# Altium footprint library PBL - SMD Packages.PcbLib: 218 footprints (part 4 of 14)
Each footprint in its own frame and in the unit in brackets; x right, y up, seen from the top. Pads: shape width x height; smd on the part's side, far side on the other; paste and mask are expansions set on the pad; w line width, h text height; cw(c..) or ccw(c..) is an arc to the next point about the centre after c.
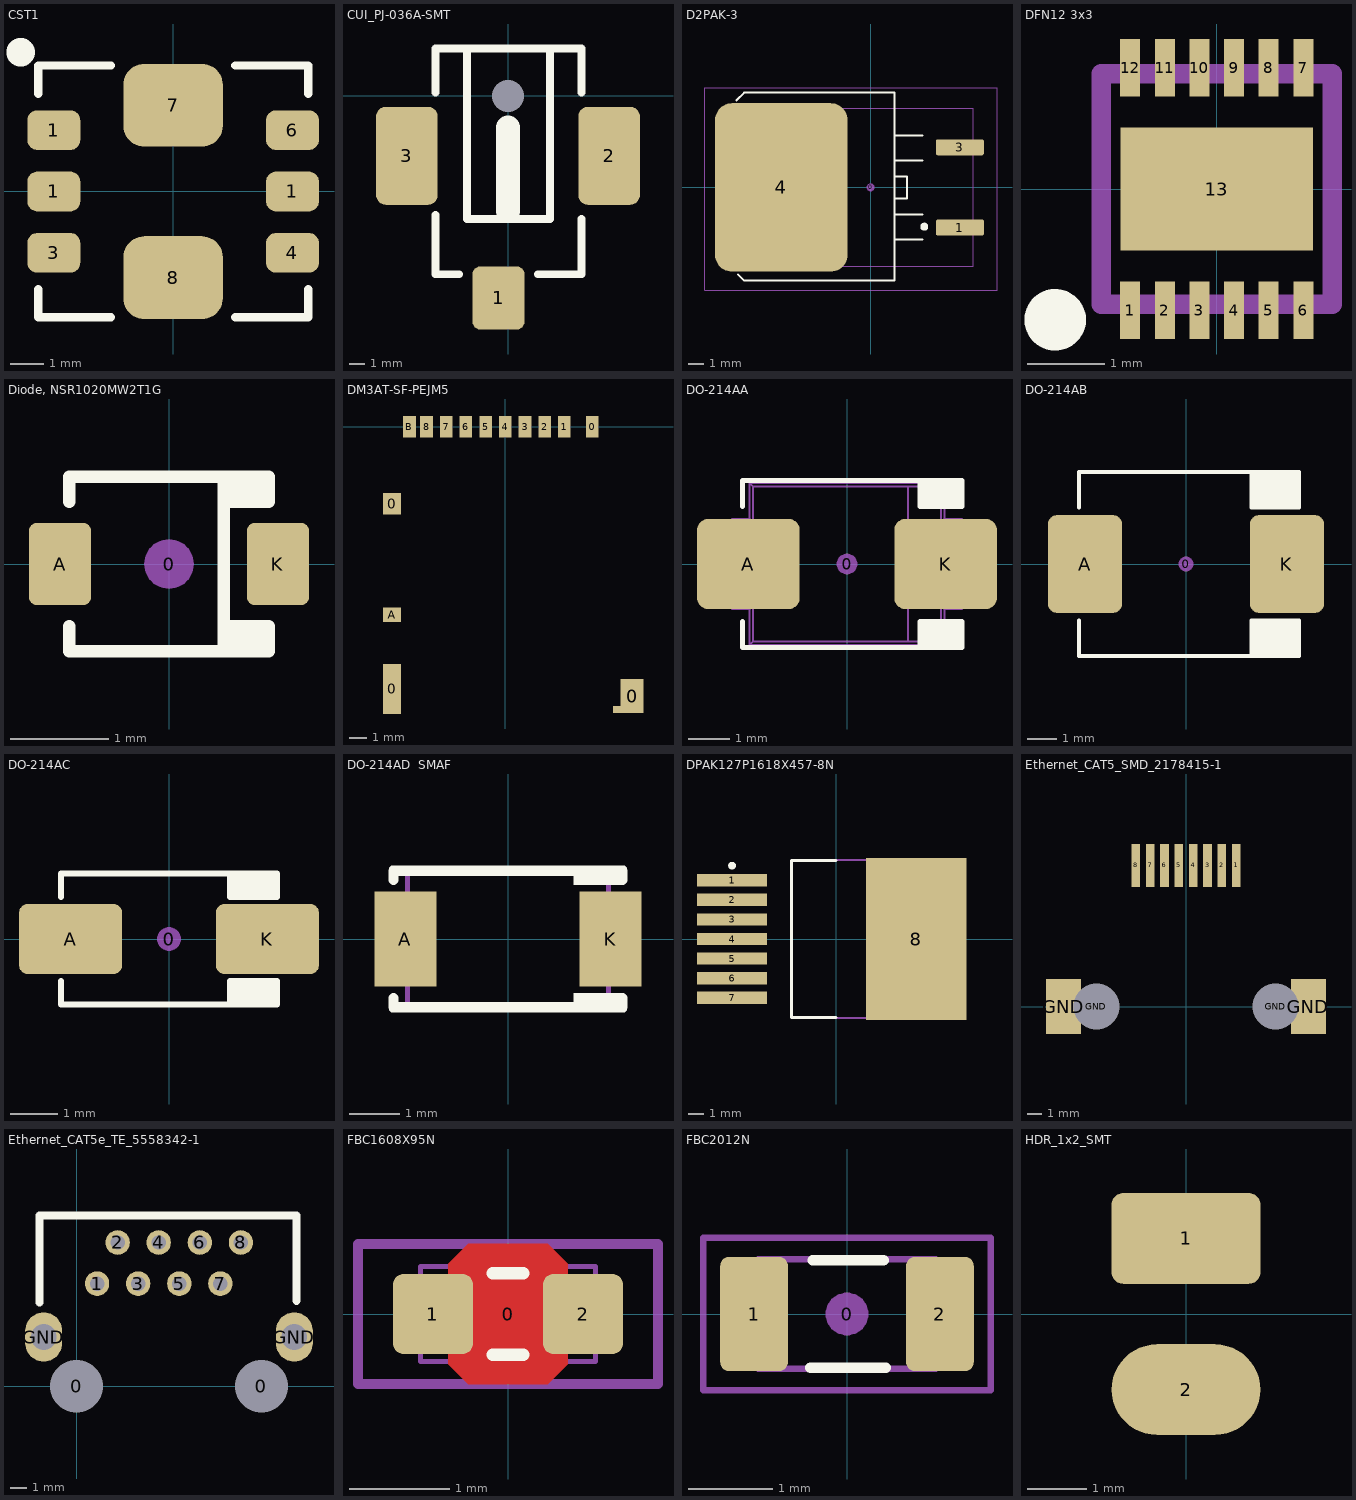
[diagram p3: the footprints below, top view; thin cyan lines are the x and y axes]

## CST1 [mm] "Current Transformer"
height 5.3
pads (8):
  rrect50% 1.6x1.2 smd: 1(-3.6,0) 1(-3.6,1.85) 1(3.6,0) 3(-3.6,-1.85) 4(3.6,-1.85) 6(3.6,1.85)
  rrect50% 3x2.5 smd: 7(0,2.6) 8(0,-2.6)
Top Overlay:
  circle w0.762: c-4.6,4.2 r0.05
  lines w0.254: -4.075,-2.95 -4.075,-3.8 -1.875,-3.8 ; -4.075,2.95 -4.075,3.8 -1.875,3.8 ; 1.875,-3.8 4.075,-3.8 4.075,-2.95 ; 1.875,3.8 4.075,3.8 4.075,2.95
3D body "Coilcraft-CST1.step": height 5.3, standoff -0.05, extent -4.065,-3.8 4.065,3.8

## CUI_PJ-036A-SMT [mm]
pads (4):
  rrect30% 3.3x4 smd: 1(-0.6,-12.8)
  rrect30% 3.9x6.2 smd: 2(6.4,-3.8) 3(-6.4,-3.8)
  rrect30% 0x0 hole 2.032 unplated: 4(0,0)
Top Overlay:
  lines w0.5: -4.6,-7.55 -4.6,-11.3 -3.1,-11.3 ; -4.6,0.2 -4.6,3 4.65,3 4.65,0.2 ; -2.6,3 -2.6,-7.8 2.65,-7.8 2.65,2.9 ; 1.9,-11.3 4.65,-11.3 4.65,-7.8
  lines w1.5: 0,-7.3 0,-2
3D body "CUI-PJ-036A-SMT.step": height 11.09, standoff -1.51, extent -7.5,-14.1 7.7,3

## D2PAK-3 [mil] "D-PAK/TO-263-3; 3 Leads (1 Cropped); Body 14.7 (inc. leads) x 10.2 mm (LxW max)"
height 180
pads (4):
  round 20 on Mech15: 0(0,0)
  rrect25% 120x40 smd: 1(222.5,-100) 3(222.5,100)
  rrect25% 330x420 smd: 4(-222.5,0)
Top Overlay:
  circle w9.84: c133.8,-97.83 r4.92
  lines w5: -334.65,216.54 -314.96,236.22 59.06,236.22 59.06,-232.28 -314.96,-232.28 -330.71,-216.54 ; 129.92,-129.92 59.06,-129.92 59.06,-66.93 129.92,-66.93 ; 129.92,66.93 59.06,66.93 59.06,129.92 129.92,129.92 ; 59.06,-27.56 90.55,-27.56 90.55,27.56 59.06,27.56 59.06,-27.56
13 - 3D Top Side:
  lines w3: -361.41,-196.85 -361.41,196.85 255.51,196.85 255.51,-196.85 -361.41,-196.85
15 - Top Courtyards:
  lines w3: -413.39,-255.91 314.96,-255.91 314.96,248.03 -413.39,248.03 -413.39,-255.91
3D body "SW3dPS-TO263-3S.STEP": height 189.36, standoff 0.39, extent -361.41,-196.85 255.51,196.85

## DFN12 3x3 [mm]
pads (13):
  rect 0.26x0.75 smd: 1(-1.125,-1.575) 2(-0.675,-1.575) 3(-0.225,-1.575) 4(0.225,-1.575) 5(0.675,-1.575) 6(1.125,-1.575) 7(1.125,1.575) 8(0.675,1.575) 9(0.225,1.575) 10(-0.225,1.575) 11(-0.675,1.575) 12(-1.125,1.575)
  rect 2.5x1.6 smd: 13(0,0)
Top Overlay:
  circle w0.4: c-2.1,-1.7 r0.2
13 - 3D Top Side:
  lines w0.254: -1.5,-1.5 -1.5,1.5 1.5,1.5 1.5,-1.5 -1.5,-1.5
3D body: height 0.9, standoff 0.1, extent -1.499,-1.499 1.499,1.499

## Diode, NSR1020MW2T1G [mil]
pads (3):
  round 20 on Mech15: 0(0,0)
  rrect25% 25x33 smd: A(-43.75,0) K(43.75,0)
Top Overlay:
  lines w5: -40,-25 -40,-35 40,-35 40,-25 22,-25 ; -40,25 -40,35 40,35 40,25 22,25 ; 22,-35 22,35 ; 25,-35 25,-25 ; 25,25 25,35 ; 28,-35 28,-25 ; 28,25 28,35 ; 31,-35 31,-25 ; 31,25 31,35 ; 34,-35 34,-25 ; 34,25 34,35 ; 37,-35 37,-25 ; 37,25 37,35

## DM3AT-SF-PEJM5 [mm]
pads (15):
  rect 1x2.8 smd: 0(-6.325,-14.65)
  rect 1x1.2 smd: 0(-6.325,-4.3)
  rect 0.7x1.2 smd: 0(4.85,0) 1(3.3,0) 2(2.2,0) 3(1.1,0) 4(0,0) 5(-1.1,0) 6(-2.2,0) 7(-3.3,0) 8(-4.4,0) B(-5.35,0)
  rect 0.4x0.4 smd: 0(6.225,-15.8)
  rect 1.3x1.9 smd: 0(7.075,-15.05)
  rect 1x0.8 smd: A(-6.325,-10.5)
Top Solder:
  rectangle: -5.075,-0.7 -4.6,0.7
3D body "DM3AT-SF-PEJM5.STEP": height 1.68, standoff 0, extent -6.4,-16 7.45,0.15

## DO-214AA [mm] "JEDEC DO214 variation AA. SMB"
height 2.65
pads (3):
  round 0.508 on Mech15: 0(0,0)
  rrect25% 2.5x2.2 smd: A(-2.4,0) K(2.4,0)
Top Overlay:
  region: 1.778,1.397 1.778,2.032 2.794,2.032 2.794,1.397
  region: 1.778,-1.397 1.778,-2.032 2.794,-2.032 2.794,-1.397
  lines w0.127: -2.54,-1.397 -2.54,-2.032 1.778,-2.032 ; -2.54,1.397 -2.54,2.032 1.778,2.032 ; 1.778,-2.032 1.778,-1.397 2.794,-1.397 2.794,-2.032 1.778,-2.032 ; 1.778,2.032 2.794,2.032 2.794,1.397 1.778,1.397 1.778,2.032
13 - 3D Top Side:
  lines w0.05: -2.375,-1.1 -2.375,-1.973 ; -2.375,1.1 -2.375,1.973 ; 2.375,-1.1 2.375,-1.973 ; 2.375,1.1 2.375,1.973 ; -2.375,-1.973 -2.373,-1.975 2.373,-1.975 2.375,-1.973 ; -2.375,-1.973 -2.285,-1.883 ; -2.375,1.973 -2.373,1.975 2.373,1.975 2.375,1.973 ; -2.375,1.973 -2.285,1.883 ; -2.285,-1.883 1.485,-1.884 ; -2.285,-1.883 -2.285,1.883 ; -2.285,1.883 1.485,1.884 ; 1.485,-1.884 2.285,-1.884 ; 1.485,-1.884 1.485,1.884 ; 1.485,1.884 2.285,1.884 ; 2.285,-1.884 2.285,1.884 ; 2.285,-1.884 2.375,-1.973 ; 2.285,1.884 2.375,1.973 ; -2.8,-1.1 -2.356,-1.1 -2.356,1.1 -2.8,1.1 -2.8,-1.1 ; 2.356,-1.1 2.8,-1.1 2.8,1.1 2.356,1.1 2.356,-1.1
3D body "DO-214AA.STEP": height 2.62, standoff 0, extent -2.8,-1.975 2.8,1.975

## DO-214AB [mm] "JEDEC DO214 variation AB. SMC"
height 2.5
pads (3):
  round 0.508 on Mech15: 0(0,0)
  rrect25% 2.5x3.3 smd: A(-3.4,0) K(3.4,0)
Top Overlay:
  rectangle: 2.2,-3.1 3.8,-1.9
  rectangle: 2.2,1.9 3.8,3.1
  lines w0.127: -3.6,-1.9 -3.6,-3.1 3.8,-3.1 3.8,-1.9 2.2,-1.9 2.2,-3.1 ; -3.6,1.9 -3.6,3.1 3.8,3.1 3.8,1.9 2.2,1.9 2.2,3.1
3D body: height 2.62, standoff 0.01, extent -3.975,-2.975 4.05,2.975

## DO-214AC [mm] "JEDEC DO214 variation AC. SMA"
height 2.5
pads (3):
  round 0.508 on Mech15: 0(0,0)
  rrect25% 2.2x1.5 smd: A(-2.1,0) K(2.1,0)
Top Overlay:
  rectangle: 1.3,0.9 2.3,1.4
  rectangle: 1.3,-1.4 2.3,-0.9
  lines w0.127: -2.3,-0.9 -2.3,-1.4 2.3,-1.4 2.3,-0.9 1.3,-0.9 1.3,-1.4 ; -2.3,0.9 -2.3,1.4 2.3,1.4 2.3,0.9 1.3,0.9 ; 1.3,0.911 1.3,1.4
3D body "SW3dPS-DO-214AC SMA.STEP": height 2.42, standoff 0.02, extent -2.6,-1.3 2.6,1.3

## DO-214AD  SMAF [mm]
height 1.1
pads (2):
  rect 1.24x1.89 smd: A(-2.04,0) K(2.04,0)
Top Overlay:
  rectangle: 1.3,1.075 2.3,1.4
  rectangle: 1.3,-1.4 2.3,-1.075
  lines w0.127: -2.3,-1.4 2.3,-1.4 ; -2.3,1.4 2.3,1.4
  lines w0.2: -2.275,-1.175 -2.275,-1.35 2,-1.35 ; -2.275,1.175 -2.275,1.35 2.275,1.35 2.275,1.175 ; 2.275,-1.35 2.275,-1.175
13 - 3D Top Side:
  lines w0.1: -2,-1.35 -2,1.35 2,1.35 2,-1.35 -2,-1.35
3D body "DO-214AD SMAF (1).step": height 1.1, standoff 0, extent -2.35,-1.35 2.35,1.35

## DPAK127P1618X457-8N [mm] "TO, 8-Pads, Body 7.66x8.48mm (max), IPC Medium Density"
height 4.57
pads (8):
  rect 4.55x0.8 smd: 1(-6.75,3.81) 2(-6.75,2.54) 3(-6.75,1.27) 4(-6.75,0) 5(-6.75,-1.27) 6(-6.75,-2.54) 7(-6.75,-3.81)
  rect 6.538x10.48 smd: 8(5.2,0)
Top Overlay:
  circle w0.25: c-6.75,4.76 r0.125
  lines w0.2: 0,-5.1 -2.9,-5.1 -2.9,5.1 0,5.1
13 - 3D Top Side:
  lines w0.1: -2.9,-5.125 6.23,-5.125 6.23,5.125 -2.9,5.125 -2.9,-5.125
3D body "DPAK127P1618X457-8N.step": height 4.82, standoff 0, extent -8.214,-5.125 7.964,5.125

## Ethernet_CAT5_SMD_2178415-1 [mm]
pads (12):
  rect 0.61x3.05 smd: 1(3.556,10) 2(2.54,10) 3(1.524,10) 4(0.508,10) 5(-0.508,10) 6(-1.524,10) 7(-2.54,10) 8(-3.556,10)
  rect 2.5x3.9 smd: GND(-8.67,0) GND(8.67,0)
  round 1.524 hole 3.25 unplated: GND(-6.35,0) GND(6.35,0)
3D body "c-2178415-1-a-3d.stp": height 14.82, standoff -1.11, extent -9.4,-5.309 9.4,11.135

## Ethernet_CAT5e_TE_5558342-1 [mil] "Jack Modular Connector 8p8c (RJ45, Ethernet) 90° Angle (Right) Shielded Cat5e"
pads (12):
  oval 59x84.5 hole 127.95 unplated: 0(0,0) 0(450,0)
  oval 59x60 hole 35.04: 1(50,250) 2(100,350) 3(150,250) 4(200,350) 5(250,250) 6(300,350) 7(350,250) 8(400,350)
  oval 90x120 hole 62.2: GND(-80,120) GND(530,120)
Top Overlay:
  lines w20: -90,204 -90,416 535,416 535,208
3D body "c-5558342-1-a-3d.stp": height 538.5, standoff -151, extent -90,-424 535,416

## FBC1608X95N [mm] "Chip Ferrite, Body 1.6x0.8mm, 0603, IPC Medium Density"
height 0.95
pads (3):
  round 0.254 on Mech15: 0(0,0)
  rrect25% 0.8x0.8 smd: 1(-0.75,0) 2(0.75,0)
Top Layer:
  pour cut-out: -0.6,0.5 -0.4,0.7 0.4,0.7 0.6,0.5 0.6,-0.5 0.4,-0.7 -0.4,-0.7 -0.6,-0.5
Top Overlay:
  lines w0.127: -0.152,-0.406 0.152,-0.406 ; -0.152,0.406 0.152,0.406
13 - 3D Top Side:
  lines w0.05: -0.475,-0.475 -0.475,0.475 ; 0.475,-0.475 0.475,0.475 ; -0.875,-0.475 0.875,-0.475 0.875,0.475 -0.875,0.475 -0.875,-0.475
15 - Top Courtyards:
  lines w0.1: -1.5,-0.7 -1.5,0.7 1.5,0.7 1.5,-0.7 -1.5,-0.7
3D body "FBC1608X95N.STEP": height 0.95, standoff 0, extent -0.875,-0.475 0.875,0.475

## FBC2012N [mm] "Ferrite Bead Chip, Body 2.0x1.2mm, 0805, IPC Medium Density"
height 0.9
pads (3):
  round 0.508 on Mech15: 0(0,0)
  rrect25% 0.8x1.35 smd: 1(-1.1,0) 2(1.1,0)
Top Overlay:
  lines w0.127: -0.432,-0.635 0.457,-0.635 ; -0.406,0.635 0.432,0.635
13 - 3D Top Side:
  lines w0.076: -1.05,-0.65 -1.05,0.65 1.05,0.65 1.05,-0.65 -1.05,-0.65
15 - Top Courtyards:
  lines w0.076: -1.7,-0.9 -1.7,0.9 1.7,0.9 1.7,-0.9 -1.7,-0.9
3D body "FBC_0805.stp": height 0.9, standoff 0, extent -1,-0.625 1,0.625

## HDR_1x2_SMT [mm]
pads (2):
  rrect25% 2.5x1.524 smd: 1(0,1.27)
  oval 2.5x1.524 smd: 2(0,-1.27)